# Altium schematic symbol library lib_datalogger.SchLib: 1246 symbols (part 13 of 16)
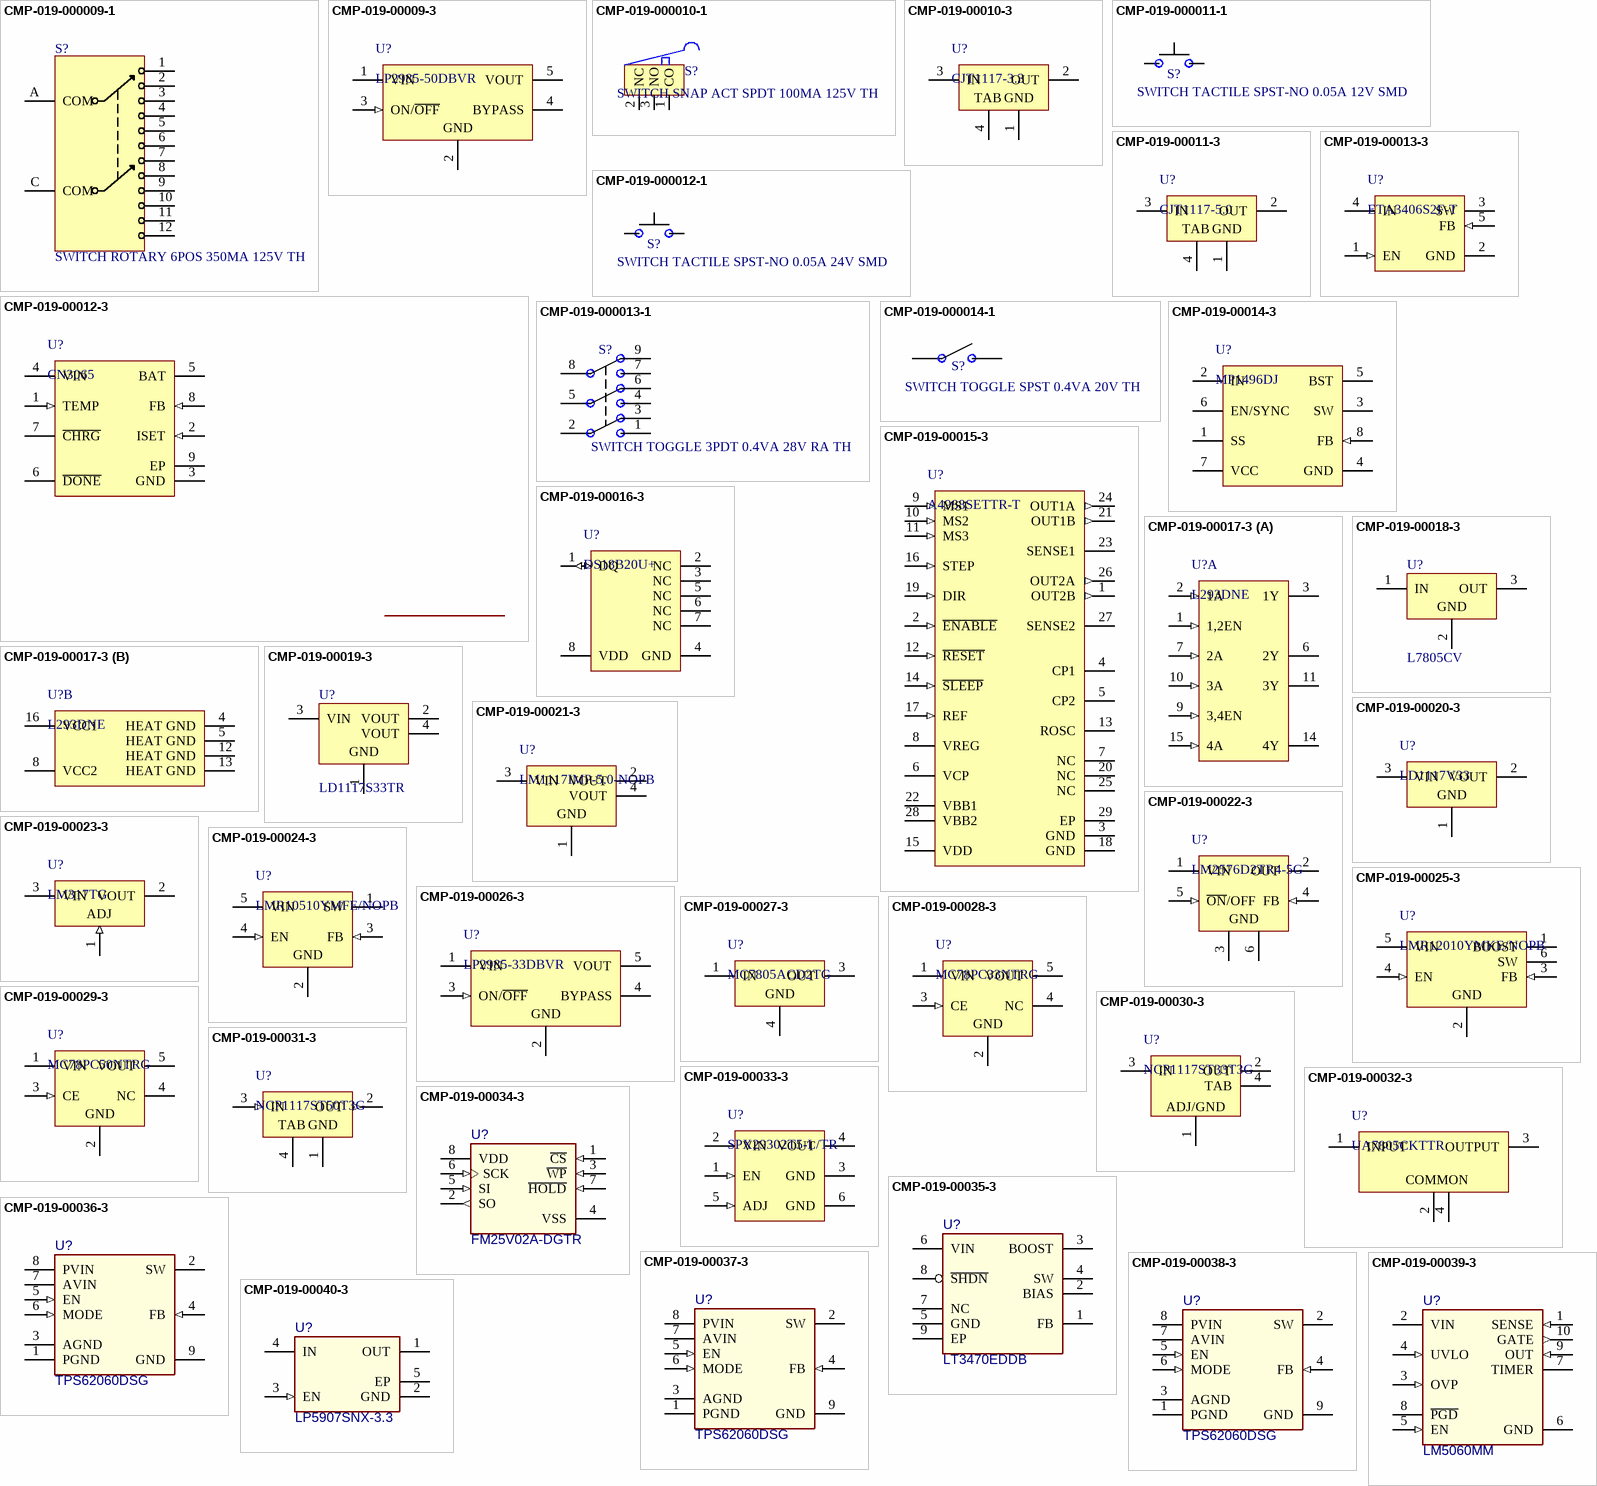
[diagram p55: symbols CMP-019-000009-1 to CMP-019-00040-3]

## CMP-019-00025-3
designator U?, comment LMR12010YMKE/NOPB
Simple Switcher(R), Step-Down Voltage Regulator, 3 to 20 V Input, 1 A, 0.8 to 17 V Output, -40 to 125 degC, 6-Pin SOT23 (DDC), Green (RoHS & no Sb/Br), Tape and Reel; Manufacturer: Texas Instruments; Outputs: 1; Output Voltage: 17V; Switching Frequency: 3MHz; Max Input Voltage: 20V; Efficiency: 90%; Min Input Voltage: 3V; Max Ouput Current: 1A; RoHS Compliant: True; Case/Package: SOT-23-6; Package Quantity: 250; Frequency: 3MHz; Pins: 6; Manufacturer URL: http://www.ti.com/; Package URL: http://www.ti.com/lit/ml/mpds124d/mpds124d.pdf; Max Operating Temperature: 125°C; Min Operating Temperature: -40°C; Package Reference: DDC0006A; Datasheet URL: http://www.ti.com/lit/ds/symlink/lmr12010.pdf; Datasheet Version: SNVS731A, 09/2011; Packaging: TapeandReel; Output Current: 1A; Package Description: 6-Pin Small Outline Transistor, Body 2.9 x 1.6 mm, Pitch 0.95 mm; Mounting Technology: SM
footprint DDC0006A_M (SOT23, 6-Leads, Body 3.05x1.75mm, Pitch 0.95mm, IPC Low Density)
footprint DDC0006A_N (SOT23, 6-Leads, Body 3.05x1.75mm, Pitch 0.95mm, IPC Medium Density)
footprint DDC0006A_L (SOT23, 6-Leads, Body 3.05x1.75mm, Pitch 0.95mm, IPC High Density)
pins: 1 BOOST "Boost voltage that drives the internal NMOS control switch. A bootstrap capacitor is connected between the BOOST and SW pins.", 2 GND (power) "Signal and Power ground pin. Place the bottom resistor of the feedback network as close as possible to this pin for accurate regulation.", 3 FB (in) "Feedback pin. Connect FB to the external resistor divider to set output voltage.", 4 EN (in) "Enable control input. Logic high enables operation. Do not allow this pin to float or be greater than VIN + 0.3V.", 5 VIN (power) "Input supply voltage. Connect a bypass capacitor to this pin.", 6 SW (power) "Output switch. Connects to the inductor, catch diode, and bootstrap capacitor."

## CMP-019-00026-3
designator U?, comment LP2985-33DBVR
Single Output Low Noise LDO, 150 mA, Fixed 3.3 V Output, 1.5% Tolerance, 2.2 to 16 V Input, Low IQ, 5-Pin SOT-23 (DBV), -40 to 125 degC, Green (RoHS & no Sb/Br), Tape and Reel; Manufacturer: Texas Instruments; Output Current: 150mA; Package Version: 4073253-4/N, 12/2014; Outputs: 1; Dropout Voltage: 3mV; Output Voltage: 3.3V; Max Input Voltage: 16V; Min Input Voltage: 2.2V; Package Description: 5-Pin Small Outline Transistor, Body 2.9 x 1.6 mm, Pitch 0.95 mm; Mounting Technology: SM; Min Operating Temperature: -40°C; Case/Package: SOT-23-5; Datasheet Version: SLVS522O, 01/2015; Package Reference: DBV5; Max Ouput Current: 150mA; Max Operating Temperature: 125°C; RoHS Compliant: True; Packaging: TapeandReel; Nominal Output Voltage: 3.3V; Package Quantity: 3000; Package URL: http://www.ti.com/lit/ml/mpds018l/mpds018l.pdf; Pins: 16; Manufacturer URL: http://www.ti.com/; Datasheet URL: http://www.ti.com/lit/ds/symlink/lp2985.pdf
footprint TI-DBV5_V (SOT23, 5-Leads, Body 3.05x1.75mm, Pitch 0.95mm)
pins: 1 VIN (power), 2 GND (power), 3 ON/~{OFF} (in), 4 BYPASS, 5 VOUT (power)

## CMP-019-00027-3
designator U?, comment MC7805ACD2TG
Positive Voltage Regulator, 5 V Output Voltage, 1 A, 0 to 125 degC, 3-Pin D2PAK (936-03), Pb-Free, Tube; Manufacturer: ON Semiconductor; Min Input Voltage: 7V; Package Version: Rev. E, 09/2015; Output Voltage: 5V; Outputs: 1; Max Input Voltage: 35V; Output Current: 1A; Dropout Voltage: 2V; Mounting Technology: SM; Package Quantity: 50; Manufacturer URL: http://www.onsemi.com/; Package Reference: D2PAK-3-936-03; Nominal Output Voltage: 5V; Packaging: Rail/Tube; Max Operating Temperature: 125°C; Datasheet URL: http://www.onsemi.com/pub_link/Collateral/MC7800-D.PDF; RoHS Compliant: True; Datasheet Version: Rev. 27, 11/2014; Case/Package: TO-263-3; Min Operating Temperature: 0°C; Max Ouput Current: 1A; Package Description: 3-Pin Flange Mount, Body 10.02 x 9.1945 mm, Pitch 2.54 mm; Package URL: http://www.onsemi.com/pub_link/Collateral/936-03.PDF; Pins: 3
footprint ONSC-D2PAK-3-936-03_V (DPAK, 3-Leads, Body 10.24x9.35mm, Pitch 2.54mm)
pins: 1 IN (power), 3 OUT (power), 4 GND (power)

## CMP-019-00028-3
designator U?, comment MC78PC33NTRG
Low Noise Low Drop Out (LDO) Linear Voltage Regulator, 3.3 V Output Voltage, 150 mA, -40 to 85 degC, 5-Pin SOT-23 (1212-01), Pb-Free, Tape and Reel; Manufacturer: ON Semiconductor; Outputs: 1; Power Rating: 250mW; Nominal Output Voltage: 3.3V; Min Input Voltage: 4.3V; Dropout Voltage: 300mV; Max Ouput Current: 150mA; Max Input Voltage: 8V; Package Quantity: 3000; Mounting Technology: SM; Case/Package: SOT-23-5; RoHS Compliant: True; Datasheet Version: Rev. 6, 06/2005; Packaging: TapeandReel; Max Operating Temperature: 85°C; Power: 250mW; Output Voltage: 3.3V; Package Reference: SOT-23-5-1212-01_O; Manufacturer URL: http://www.onsemi.com/; Package Description: 5-Pin Small Outline Transistor, Body 2.9 x 1.65 mm, Pitch 0.95 mm; Output Current: 150mA; Datasheet URL: http://www.onsemi.com/pub_link/Collateral/MC78PC00-D.PDF; Min Operating Temperature: -40°C; Pins: 5
footprint ONSC-SOT-23-5-1212-01_O_V (SOT23, 5-Leads, Body 3x1.80mm, Pitch 0.95mm)
pins: 1 VIN (power) "Input Pin", 2 GND (power) "Ground Pin", 3 CE (in) "Chip Enable Pin", 4 NC "No Connection", 5 VOUT (power) "Output Pin"

## CMP-019-00029-3
designator U?, comment MC78PC50NTRG
Low Noise Low Drop Out (LDO) Linear Voltage Regulator, 5 V Output Voltage, 150 mA, -40 to 85 degC, 5-Pin SOT-23 (1212-01), Pb-Free, Tape and Reel; Manufacturer: ON Semiconductor; Dropout Voltage: 260mV; Outputs: 1; Power: 250mW; Output Current: 150mA; Max Input Voltage: 8V; Output Voltage: 5V; Package Quantity: 3000; Packaging: TapeandReel; Max Operating Temperature: 85°C; Mounting Technology: SM; Pins: 5; Datasheet Version: Rev. 6, 06/2005; Min Operating Temperature: -40°C; Package Description: 5-Pin Small Outline Transistor, Body 2.9 x 1.65 mm, Pitch 0.95 mm; Datasheet URL: http://www.onsemi.com/pub_link/Collateral/MC78PC00-D.PDF; RoHS Compliant: True; Case/Package: SOT-23-5; Manufacturer URL: http://www.onsemi.com/; Package Reference: SOT-23-5-1212-01_O
footprint ONSC-SOT-23-5-1212-01_O_V (SOT23, 5-Leads, Body 3x1.80mm, Pitch 0.95mm)
pins: 1 VIN (power) "Input Pin", 2 GND (power) "Ground Pin", 3 CE (in) "Chip Enable Pin", 4 NC "No Connection", 5 VOUT (power) "Output Pin"

## CMP-019-00030-3
designator U?, comment NCP1117ST33T3G
Low-Dropout Positive Fixed Voltage Regulator, 1 A, 3.3 V Output Voltage, 0 to 125 degC, 4-Pin SOT-223 (318H-01), Pb-Free, Tape and Reel; Manufacturer: ON Semiconductor; Max Supply Voltage: 15V; Min Input Voltage: 3.5V; Max Ouput Current: 1A; Output Voltage: 3.3V; Outputs: 1; Min Supply Voltage: 4.75V; Max Input Voltage: 20V; Dropout Voltage: 1.1V; Package Reference: SOT-223-4-318H-01_A; Package Quantity: 4000; Manufacturer URL: http://www.onsemi.com/; Mounting Technology: SM; Output Current: 1A; Min Operating Temperature: 0°C; Datasheet URL: http://www.onsemi.com/pub_link/Collateral/NCP1117-D.PDF; RoHS Compliant: True; Pins: 3; Case/Package: SOT-223-4; Packaging: TapeandReel; Max Operating Temperature: 125°C; Package Description: 4-Pin Small Outline Transistor, Body 6.5 x 3.5 mm, Pitch 2.3 mm; Nominal Output Voltage: 3.3V; Datasheet Version: Rev. 27, 09/2014
footprint ONSC-SOT-223-4-318H-01_A_V (SOT223, 4-Leads, Body 6.7x3.7mm, Pitch 2.3mm)
pins: 1 ADJ/GND, 2 OUT (power), 3 IN (power), 4 TAB

## CMP-019-00031-3
designator U?, comment NCP1117ST50T3G
Low-Dropout Positive Fixed Voltage Regulator, 1 A, 5 V Vout, 0 to 125 degC, 4-Pin SOT-223, Pb-Free, Tape and Reel; Manufacturer: ON Semiconductor; Current Rating: -600A; Output Voltage: 5V; Max Ouput Current: 1A; Max Input Voltage: 20V; Outputs: 1; Dropout Voltage: 1.2V; Min Input Voltage: 3.5V; Datasheet Version: Rev. 26, 08/2013; Package Quantity: 4000; Package Description: 4-Pin Small Outline Transistor, Body 6.5 x 3.5 mm, Pitch 2.3 mm; RoHS Compliant: True; Max Operating Temperature: 125°C; Nominal Output Voltage: 5V; Datasheet URL: https://datasheet.ciiva.com/28483/1748260-28483320.pdf; Min Operating Temperature: 0°C; Manufacturer URL: http://www.onsemi.com/; Output Current: 1A; Pins: 3; Mounting Technology: SM; Package Reference: SOT-223-4-318H-01_A; Case/Package: TO-261-4; Packaging: TapeandReel
footprint ONSC-SOT-223-4-318H-01_A_V (SOT223, 4-Leads, Body 6.7x3.7mm, Pitch 2.3mm)
pins: 1 GND (power), 2 OUT (out), 3 IN (in), 4 TAB (power)

## CMP-019-00032-3
designator U?, comment UA7805CKTTR
Fixed Positive Voltage Regulator, 7 to 25 V, 1.5 A, 0 to 125 degC, 3-Pin DDPAK (KTT), Green (RoHS & no Sb/Br), Tape and Reel; Manufacturer: Texas Instruments; Max Ouput Current: 1.5A; Min Input Voltage: 7V; Nominal Output Voltage: 5V; Outputs: 1; Dropout Voltage: 2V; Max Input Voltage: 25V; Manufacturer URL: http://www.ti.com/; Package Reference: KTT0003A; Pins: 3; Min Operating Temperature: 0°C; Mounting Technology: SM; Package Quantity: 500; Packaging: TapeandReel; Datasheet URL: http://www.ti.com/lit/ds/symlink/ua7805.pdf; Case/Package: TO-263-4; Output Voltage: 5V; RoHS Compliant: True; Datasheet Version: SLVS056P, 01/2015; Output Current: 1.5A; Package Description: 3-Pin Surface Mount Device, Body 10.16 x 9.015 mm, Pitch 2.54 mm; Max Operating Temperature: 125°C
footprint KTT0003A_V (DPAK, 3-Leads, Body 10.65x9.65mm, Pitch 2.54mm)
pins: 1 INPUT (power) "Supply Input", 2 COMMON (power) "Ground", 3 OUTPUT (power) "Voltage Output", 4 COMMON (power) "Ground"

## CMP-019-00033-3
designator U?, comment SPX29302T5-L/TR
Highly Accurate Voltage Regulator, 3 A, 1.25 to 16 V, -40 to 125 degC, 6-Pin DPAK, RoHS, Tape and Reel; Manufacturer: Exar Corporation; Pins: 6; Manufacturer URL: https://www.exar.com/; Package Description: 6-Pin Transistor Outline, Body 9.015 x 10.16 mm, Pitch 1.7 mm; Datasheet URL: https://www.exar.com/content/document.ashx?id=1328; Mounting Technology: SM; Max Operating Temperature: 125°C; RoHS Compliant: True; Package Reference: DPAK; Packaging: TapeandReel; Datasheet Version: Rev. 2.1.0, 10/2011; Min Operating Temperature: -40°C; Voltage: 1.25to16V; Case/Package: DPAK
footprint EXAR-TO263-5_N (D2-PAK, 6-Pads, Body 9.02x10.15mm, IPC Medium Density)
footprint EXAR-TO263-5_L (D2-PAK, 6-Pads, Body 9.02x10.15mm, IPC High Density)
footprint EXAR-TO263-5_M (D2-PAK, 6-Pads, Body 9.02x10.15mm, IPC Low Density)
pins: 1 EN (in), 2 VIN (power), 3 GND (power), 4 VOUT (power), 5 ADJ (in), 6 GND (power)

## CMP-019-00034-3
designator U?, comment FM25V02A-DGTR
REEL / F-RAM Memory Serial; Speed: 40MHz; Memory Format: FRAM,RAM; Pins: 8; Min Operating Temperature: -40°C; Case/Package: DFN; Max Operating Temperature: 85°C
footprint SON95P400X75_HS-9N (SON, 8-Leads, Body 4,50x4,00mm, Pitch 0,95mm, Thermal Pad 2,61x2,88mm, IPC Medium Density)
footprint SON95P400X75_HS-9N (SON, 8-Leads, Body 4,50x4,00mm, Pitch 0,95mm, Thermal Pad 2,61x2,88mm, IPC Medium Density)
pins: 1 ~{CS} (in) "Chip Select. This active LOW input activates the device. When HIGH, the device enters the  low-power standby mode, ignores other inputs, and the output is tristated. When LOW, the device  internally activates the SCK signal. A falling edge on C\S\ must occur before every opcode.", 2 SO (out) "Serial Output. This is the data output pin. It is driven during a read and remains tristated at all other  times including when H\O\L\D\ is LOW. Data transitions are driven on the falling edge of the serial clock.", 3 ~{WP} (in) "Write Protect. This active LOW pin prevents write operation to the Status Register when WPEN is  set to ‘1’. This is critical because other write protection features are controlled through the Status  Register.", 4 VSS (power) "Ground for the device. Must be connected to the ground of the system.", 5 SI (in) "Serial Input. All data is input to the device on this pin. The pin is sampled on the rising edge of SCK  and is ignored at other times. It should always be driven to a valid logic level to meet IDD specifications.", 6 SCK (in) "Serial Clock. All I/O activity is synchronized to the serial clock. Inputs are latched on the rising edge  and outputs occur on the falling edge. Because the device is synchronous, the clock frequency may  be any value between 0 and 40 MHz and may be interrupted at any time.", 7 ~{HOLD} (in) "The H\O\L\D\ pin is used when the host CPU must interrupt a memory operation for another  task. When H\O\L\D\ is LOW, the current operation is suspended. The device ignores any transition  on SCK or C\S\. All transitions on H\O\L\D\ must occur while SCK is LOW. This pin has a weak internal  pull-up", 8 VDD (power) "Power supply input to the device."

## CMP-019-00035-3
designator U?, comment LT3470EDDB
Micropower Buck Regulator with Integrated Boost and Catch Diode, 8-pin SON (DDB-8), -40 to 85 degC, Tape and Reel; Output Voltage: 16V; Pins: 9; Case/Package: DFN; Min Operating Temperature: -40°C; Max Operating Temperature: 85°C
footprint LT-DDB-8_V (SON, 8-Leads, Body 3x2mm, Pitch 0.5mm, Thermal Pad 2.2x0.61mm)
footprint LT-DDB-8_V (SON, 8-Leads, Body 3x2mm, Pitch 0.5mm, Thermal Pad 2.2x0.61mm)
pins: 1 FB "The LT3470X regulates its feedback pin to 1.25V. Connect the feedback resistor divider tap to this pin. Set the output voltage according to VOUT = 1.25V (1 + R1/R2) or R1 = R2 (VOUT/1.25 - 1).", 2 BIAS (power) "The BIAS pin connects to the internal boost Schottky diode and to the internal regulator. Tie to VOUT when VOUT > 2.5V or to VIN otherwise. When VBIAS > 3V the BIAS pin will supply current to the internal regulator.", 3 BOOST "The BOOST pin is used to provide a drive voltage, which is higher than the input voltage, to the internal bipolar NPN power switch.", 4 SW (power) "The SW pin is the output of the internal power switch. Connect this pin to the inductor, catch diode and boost capacitor.", 5 GND "This pin can be left floating, connected to VIN, or tied to GND.", 6 VIN (power) "The VIN pin supplies current to the LT3470X’s internal regulator and to the internal power switch. This pin must be locally bypassed.", 7 NC "This pin can be left floating, connected to VIN, or tied to GND.", 8 ~{SHDN} "The S\H\D\N\ pin is used to put the LT3470X in shutdown mode. Tie to ground to shut down the LT3470A. Apply 2V or more for normal operation. If the shutdown feature is not used, tie this pin to the VIN pin.", 9 EP "This pin can be left floating, connected to VIN, or tied to GND."

## CMP-019-00036-3
designator U?, comment TPS62060DSG
Step Down Converter, 3 MHz, 1.6 A, -45 to 85 degC, 8-Pin WSON, RoHS, Tape and Reel; Pins: 9
footprint DSG0008A_V (SON, 8-Leads, Body 2x2mm, Pitch 0.5mm, Thermal Pad 1.6x0.9mm, TI Recommended)
footprint DSG0008A_V (SON, 8-Leads, Body 2x2mm, Pitch 0.5mm, Thermal Pad 1.6x0.9mm, TI Recommended)
pins: 1 PGND (power) "GND supply pin for the output stage.", 2 SW (power) "This is the switch pin and is connected to the internal MOSFET switches. Connect the external inductor between this terminal and the output capacitor.", 3 AGND (power) "Analog GND supply pin for the control circuit.", 4 FB (in) "Feedback pin for the internal regulation loop. Connect the external resistor divider to this pin. In case of fixed output voltage option, connect this pin directly to the output capacitor", 5 EN (in) "This is the enable pin of the device. Pulling this pin to low forces the device into shutdown mode. Pulling this pin to high enables the device. This pin must be terminated", 6 MODE (in) "MODE: MODE pin = high forces the device to operate in fixed frequency PWM mode. MODE pin = low enables the Power Save Mode with automatic transition from PFM mode to fixed frequency PWM mode.", 7 AVIN (power) "Analog VIN power supply for the control circuit. Need to be connected to PVIN and input capacitor.", 8 PVIN (power) "VIN power supply pin for the output stage.", 9 GND (power) "For good thermal performance, this PAD must be soldered to the land pattern on the pcb. This PAD should be used as device GND."

## CMP-019-00037-3
designator U?, comment TPS62060DSG
Step Down Converter, 3 MHz, 1.6 A, -45 to 85 degC, 8-Pin WSON, RoHS, Tape and Reel; Pins: 9
footprint DSG0008A_V (SON, 8-Leads, Body 2x2mm, Pitch 0.5mm, Thermal Pad 1.6x0.9mm, TI Recommended)
footprint DSG0008A_V (SON, 8-Leads, Body 2x2mm, Pitch 0.5mm, Thermal Pad 1.6x0.9mm, TI Recommended)
pins: 1 PGND (power) "GND supply pin for the output stage.", 2 SW (power) "This is the switch pin and is connected to the internal MOSFET switches. Connect the external inductor between this terminal and the output capacitor.", 3 AGND (power) "Analog GND supply pin for the control circuit.", 4 FB (in) "Feedback pin for the internal regulation loop. Connect the external resistor divider to this pin. In case of fixed output voltage option, connect this pin directly to the output capacitor", 5 EN (in) "This is the enable pin of the device. Pulling this pin to low forces the device into shutdown mode. Pulling this pin to high enables the device. This pin must be terminated", 6 MODE (in) "MODE: MODE pin = high forces the device to operate in fixed frequency PWM mode. MODE pin = low enables the Power Save Mode with automatic transition from PFM mode to fixed frequency PWM mode.", 7 AVIN (power) "Analog VIN power supply for the control circuit. Need to be connected to PVIN and input capacitor.", 8 PVIN (power) "VIN power supply pin for the output stage.", 9 GND (power) "For good thermal performance, this PAD must be soldered to the land pattern on the pcb. This PAD should be used as device GND."

## CMP-019-00038-3
designator U?, comment TPS62060DSG
Step Down Converter, 3 MHz, 1.6 A, -45 to 85 degC, 8-Pin WSON, RoHS, Tape and Reel; Pins: 9
footprint DSG0008A_V (SON, 8-Leads, Body 2x2mm, Pitch 0.5mm, Thermal Pad 1.6x0.9mm, TI Recommended)
footprint DSG0008A_V (SON, 8-Leads, Body 2x2mm, Pitch 0.5mm, Thermal Pad 1.6x0.9mm, TI Recommended)
pins: 1 PGND (power) "GND supply pin for the output stage.", 2 SW (power) "This is the switch pin and is connected to the internal MOSFET switches. Connect the external inductor between this terminal and the output capacitor.", 3 AGND (power) "Analog GND supply pin for the control circuit.", 4 FB (in) "Feedback pin for the internal regulation loop. Connect the external resistor divider to this pin. In case of fixed output voltage option, connect this pin directly to the output capacitor", 5 EN (in) "This is the enable pin of the device. Pulling this pin to low forces the device into shutdown mode. Pulling this pin to high enables the device. This pin must be terminated", 6 MODE (in) "MODE: MODE pin = high forces the device to operate in fixed frequency PWM mode. MODE pin = low enables the Power Save Mode with automatic transition from PFM mode to fixed frequency PWM mode.", 7 AVIN (power) "Analog VIN power supply for the control circuit. Need to be connected to PVIN and input capacitor.", 8 PVIN (power) "VIN power supply pin for the output stage.", 9 GND (power) "For good thermal performance, this PAD must be soldered to the land pattern on the pcb. This PAD should be used as device GND."

## CMP-019-00039-3
designator U?, comment LM5060MM
High-Side Protection Controller with Low Quiescent Current, 5.5 to 65 V, -40 to 125 degC, 10-Pin VSSOP, RoHS, Tape and Reel; Min Supply Voltage: 5.5V; Max Supply Voltage: 65V; Pins: 10; Max Operating Temperature: 125°C; Min Operating Temperature: -40°C
footprint DGS0010A_N (SOP, 10-Leads, Body 3.1x3.1mm, Pitch 0.5mm, IPC Medium Density)
footprint DGS0010A_N (SOP, 10-Leads, Body 3.1x3.1mm, Pitch 0.5mm, IPC Medium Density)
pins: 1 SENSE (in), 2 VIN (power), 3 OVP (in), 4 UVLO (in), 5 EN (in), 6 GND (power), 7 TIMER, 8 ~{PGD} (oc), 9 OUT (in), 10 GATE (out)

## CMP-019-00040-3
designator U?, comment LP5907SNX-3.3
Ultra-Low-Noise, Low-IQ LDO, 3.3 V, 0.25 A, -40 to 125 degC, 4-Pin X2SON, RoHS, Tape and Reel; Output Voltage: 3.3V; Pins: 5; Max Operating Temperature: 125°C; Min Operating Temperature: -40°C
footprint TI-DQN4-480X480TP_V (SON, 4-Leads, Body 1x1mm, Pitch 0.65mm, Thermal Pad 0.5x0.5mm)
footprint TI-DQN4-480X480TP_V (SON, 4-Leads, Body 1x1mm, Pitch 0.65mm, Thermal Pad 0.5x0.5mm)
pins: 1 OUT (power) "Output voltage. A 1-uF Low ESR capacitor should be connected to this pin. Connect this output to the load circuit. An internal 280 Ohm discharge resistor prevents a charge remaining on VOUT when VEN is low.", 2 GND (power) "Common ground", 3 EN (in) "Enable input", 4 IN (power) "Input voltage supply. A 1-µF capacitor should be connected at this input.", 5 EP (power) "Thermal pad for X2SON package, connect to GND or Floating"

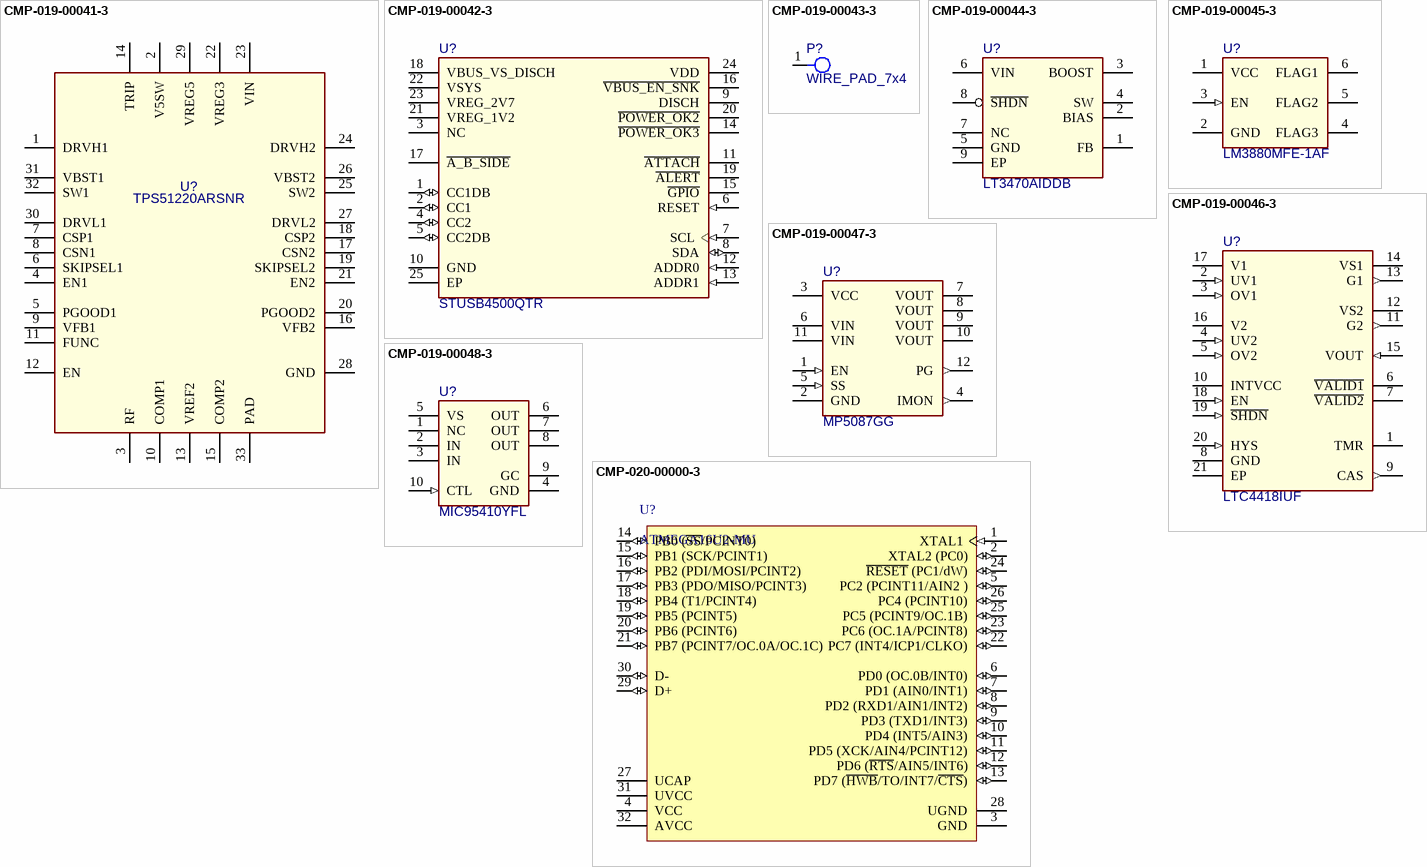
[diagram p36: symbols CMP-019-00041-3 to CMP-020-00000-3]

## CMP-019-00041-3
designator U?, comment TPS51220ARSNR
Fixed Frequency, 99% Duty Cycle Peak Current Mode Notebook System Power Controller; Output Voltage: 12V; Max Supply Voltage: 32V; Min Operating Temperature: -40°C; Max Operating Temperature: 85°C; Pins: 33
footprint RSN0032B (Texas Instruments)
footprint RSN0032B (Texas Instruments)
pins: 1 DRVH1, 2 V5SW, 3 RF, 4 EN1, 5 PGOOD1, 6 SKIPSEL1, 7 CSP1, 8 CSN1, 9 VFB1, 10 COMP1, 11 FUNC, 12 EN, 13 VREF2, 14 TRIP, 15 COMP2, 16 VFB2, 17 CSN2, 18 CSP2, 19 SKIPSEL2, 20 PGOOD2, 21 EN2, 22 VREG3, 23 VIN, 24 DRVH2, 25 SW2, 26 VBST2, 27 DRVL2, 28 GND, 29 VREG5, 30 DRVL1, 31 VBST1, 32 SW1, 33 PAD

## CMP-019-00042-3
designator U?, comment STUSB4500QTR
Standalone USB PD Sink Controller with Short-to-VBUS Protections, 4.1 to 22 V, -45 to 105 degC, 24-Pin QFN, RoHS, Tape and Reel; Pins: 25
footprint STM-QFN-24_V (QFN, 24-Leads, Body 4x4mm, Pitch 0.5mm, Thermal Pad 2.7x2.7mm)
footprint STM-QFN-24_V (QFN, 24-Leads, Body 4x4mm, Pitch 0.5mm, Thermal Pad 2.7x2.7mm)
pins: 1 CC1DB (io) "Dead battery enable on CC1 pin", 2 CC1 (io) "Type-C configuration channel 1", 3 NC, 4 CC2 (io) "Type-C configuration channel 2", 5 CC2DB (io) "Dead battery enable on CC2 pin", 6 RESET (in) "Reset input, active high", 7 SCL (in) "I2C clock input", 8 SDA (io) "I2C data input/output, active low open drain", 9 DISCH (oc) "Internal discharge path or external discharge path enable, active low open drain", 10 GND (power) "Ground", 11 ~{ATTACH} (oc) "Attachment detection, active low open drain", 12 ADDR0 (in) "I²C device address setting", 13 ADDR1 (in) "I²C device address setting", 14 ~{POWER_OK3} (oc) "Power contract flag, active low open drain", 15 ~{GPIO} (oc) "General purpose output, active low open drain", 16 ~{VBUS_EN_SNK} (oc) "VBUS sink power path enable, active low open drain", 17 ~{A_B_SIDE} (oc) "Cable orientation, active low open drain", 18 VBUS_VS_DISCH "VBUS voltage monitoring and discharge path", 19 ~{ALERT} (oc) "I2C interrupt, active low open drain", 20 ~{POWER_OK2} (oc) "Power contract flag, active low open drain", 21 VREG_1V2 (power) "1.2 V internal regulator output", 22 VSYS (power) "Power supply from system", 23 VREG_2V7 (power) "2.7 V internal regulator output", 24 VDD (power) "Power supply from USB power line", 25 EP (power) "Exposed pad is connected to ground"

## CMP-019-00043-3
designator P?, comment WIRE_PAD_7x4  (no BOM)
SMD WIRE PAD 7 x 4 mm; Pins: 1
footprint WIRE_PAD_7x4-Footprint-1
footprint WIRE_PAD_7x4-Footprint-1
pins: 1 H1

## CMP-019-00044-3
designator U?, comment LT3470AIDDB
Micropower Buck Regulator with Integrated Boost and Catch Diode, 8-pin SON (DDB-8), -40 to 85 degC; Output Voltage: 16V; Pins: 9; Min Operating Temperature: -40°C; Max Operating Temperature: 125°C; Case/Package: DFN
footprint LT-DDB-8_V (SON, 8-Leads, Body 3x2mm, Pitch 0.5mm, Thermal Pad 2.2x0.61mm)
footprint LT-DDB-8_V (SON, 8-Leads, Body 3x2mm, Pitch 0.5mm, Thermal Pad 2.2x0.61mm)
pins: 1 FB "The LT3470X regulates its feedback pin to 1.25V. Connect the feedback resistor divider tap to this pin. Set the output voltage according to VOUT = 1.25V (1 + R1/R2) or R1 = R2 (VOUT/1.25 - 1).", 2 BIAS (power) "The BIAS pin connects to the internal boost Schottky diode and to the internal regulator. Tie to VOUT when VOUT > 2.5V or to VIN otherwise. When VBIAS > 3V the BIAS pin will supply current to the internal regulator.", 3 BOOST "The BOOST pin is used to provide a drive voltage, which is higher than the input voltage, to the internal bipolar NPN power switch.", 4 SW (power) "The SW pin is the output of the internal power switch. Connect this pin to the inductor, catch diode and boost capacitor.", 5 GND "This pin can be left floating, connected to VIN, or tied to GND.", 6 VIN (power) "The VIN pin supplies current to the LT3470X’s internal regulator and to the internal power switch. This pin must be locally bypassed.", 7 NC "This pin can be left floating, connected to VIN, or tied to GND.", 8 ~{SHDN} "The S\H\D\N\ pin is used to put the LT3470X in shutdown mode. Tie to ground to shut down the LT3470A. Apply 2V or more for normal operation. If the shutdown feature is not used, tie this pin to the VIN pin.", 9 EP "This pin can be left floating, connected to VIN, or tied to GND."

## CMP-019-00045-3
designator U?, comment LM3880MFE-1AF
Power Sequencer, 6-pin SOT-23, 250 Reel; RoHS Compliant: Y; ComponentLink1Description: Datasheet URL; ComponentLink1URL: http://www.ti.com/general/docs/lit/getliterature.tsp?genericPartNumber=LM3880&fileType=pdf; Pins: 6
footprint DBV0006A_N (SOT23, 6-Leads, Body 3.05x1.75mm, Pitch 0.95mm, IPC Medium Density)
footprint DBV0006A_N (SOT23, 6-Leads, Body 3.05x1.75mm, Pitch 0.95mm, IPC Medium Density)
pins: 1 VCC (power), 2 GND (power), 3 EN (in), 4 FLAG3 (oc), 5 FLAG2 (oc), 6 FLAG1 (oc)

## CMP-019-00046-3
designator U?, comment LTC4418IUF
Prioritized 2:1 PowerPath™ Controller, 2.5 to 40 V, -40 to 85 degC, 20-Pin QFN, RoHS; Pins: 21
footprint ADI-UF-20_V (SMD, 20-Leads, Body 4x4mm, Pitch 0.5mm)
footprint ADI-UF-20_V (SMD, 20-Leads, Body 4x4mm, Pitch 0.5mm)
pins: 1 TMR, 2 UV1 (in), 3 OV1 (in), 4 UV2 (in), 5 OV2 (in), 6 ~{VALID1} (oc), 7 ~{VALID2} (oc), 8 GND (power), 9 CAS (out), 10 INTVCC, 11 G2 (out), 12 VS2, 13 G1 (out), 14 VS1, 15 VOUT (in), 16 V2 (power), 17 V1 (power), 18 EN (in), 19 ~{SHDN} (in), 20 HYS (in), 21 EP (power)

## CMP-019-00047-3
designator U?, comment MP5087GG
Low RDSON Load Switch with Current Monitoring, 5.5 V, 7 A, -40 to 125 degC, 12-Pin QFN, RoHS; Mounting Technology: SMT; Pins: 12
footprint MPS-QFN-12_V (QFN, 12-Leads, Body 2x2mm, Pitch 0.4mm)
footprint MPS-QFN-12_V (QFN, 12-Leads, Body 2x2mm, Pitch 0.4mm)
pins: 1 EN (in), 2 GND (power), 3 VCC (power), 4 IMON (out), 5 SS (in), 6 VIN, 7 VOUT, 8 VOUT, 9 VOUT, 10 VOUT, 11 VIN, 12 PG (out)

## CMP-019-00048-3
designator U?, comment MIC95410YFL
High Side Load Switch, 2.7 to 9 V, 7 A, 6.6 mOhm, -40 to 125 degC, 10-Pin QFN, RoHS; Pins: 10; Mounting Technology: SMT
footprint MCHP-QFN-10_V (QFN, 10-Leads, Body 1.2x2mm, Pitch 0.5mm)
footprint MCHP-QFN-10_V (QFN, 10-Leads, Body 1.2x2mm, Pitch 0.5mm)
pins: 1 NC, 2 IN, 3 IN, 4 GND (power), 5 VS (power), 6 OUT, 7 OUT, 8 OUT, 9 GC, 10 CTL (in)

## CMP-020-00000-3
designator U?, comment ATMEGA16U2-MU
8-Bit Microcontroller with ISP Flash and USB Controller, 16 KB, 16 MHz, 2.7 to 5.5 V, -40 to 85 degC, 32-Pin VQFN, RoHS, Tray; Manufacturer: Atmel; Package Version: Rev. N, 01/2015; Max Clock Frequency: 16MHz; I/Os: 22; Density: 16KB; Min Supply Voltage: 2.7V; RAM Size: 1.25KB; Interface: UART; Max Supply Voltage: 5.5V; RoHS Compliant: True; Case/Package: QFN; Max Operating Temperature: 85°C; Package Description: 32-Pin Quad Flat No Lead Package, Body 5 x 5 mm, Pitch 0.5 mm; Min Operating Temperature: -40°C; Mounting Technology: SM; Datasheet Version: Rev. 7799E, 09/2012; Package Reference: QFN32; Package Quantity: 2450; Frequency: 16MHz; Datasheet URL: http://www.atmel.com/Images/doc7799.pdf; Packaging: Tray; Pins: 32; Package URL: http://www.atmel.com/images/atmel-42129-sam-d20_datasheet.pdf; Manufacturer URL: http://www.atmel.com/
footprint ATML-QFN-32_N (QFN, 32-Leads, Body 5.00x5.00mm, Pitch 0.50mm, Thermal Pad 3.60x3.60mm, IPC Medium Density)
footprint ATML-QFN-32_L (QFN, 32-Leads, Body 5x5mm, Pitch 0.5mm, Thermal Pad 3.6x3.6mm, IPC High Density)
footprint ATML-QFN-32_M (QFN, 32-Leads, Body 5x5mm, Pitch 0.5mm, Thermal Pad 3.6x3.6mm, IPC Low Density)
pins: 1 XTAL1 (in) "Input to the inverting Oscillator amplifier and input to the internal clock operating circuit.", 2 XTAL2 (PC0) (io), 3 GND (power) "Ground.", 4 VCC (power) "Digital supply voltage.", 5 PC2 (PCINT11/AIN2 ) (io), 6 PD0 (OC.0B/INT0) (io), 7 PD1 (AIN0/INT1) (io), 8 PD2 (RXD1/AIN1/INT2) (io), 9 PD3 (TXD1/INT3) (io), 10 PD4 (INT5/AIN3) (io), 11 PD5 (XCK/AIN4/PCINT12) (io), 12 PD6 (~{RTS}/AIN5/INT6) (io), 13 PD7 (~{HWB}/TO/INT7/~{CTS}) (io), 14 PB0 (~{SS}/PCINT0) (io), 15 PB1 (SCK/PCINT1) (io), 16 PB2 (PDI/MOSI/PCINT2) (io), 17 PB3 (PDO/MISO/PCINT3) (io), 18 PB4 (T1/PCINT4) (io), 19 PB5 (PCINT5) (io), 20 PB6 (PCINT6) (io), 21 PB7 (PCINT7/OC.0A/OC.1C) (io), 22 PC7 (INT4/ICP1/CLKO) (io), 23 PC6 (OC.1A/PCINT8) (io), 24 ~{RESET} (PC1/dW) (io), 25 PC5 (PCINT9/OC.1B) (io), 26 PC4 (PCINT10) (io), 27 UCAP (power) "USB Pads Internal Regulator Output supply voltage. Should be connected to an external capacitor (1uF).", 28 UGND (power) "USB Ground.", 29 D+ (io) "USB Full Speed Positive Data Upstream Port", 30 D- (io) "USB Full Speed Negative Data Upstream Port", 31 UVCC (power) "USB Pads Internal Regulator Input supply voltage.", 32 AVCC (power) "AVCC is the supply voltage pin (input) for all analog features (Analog Comparator, PLL). It should be externally connected to VCC through a low-pass filter."
